# Altium footprint library MS-Electronic.PcbLib: 213 footprints (part 9 of 14)
Each footprint in its own frame and in the unit in brackets; x right, y up, seen from the top. Pads: shape width x height; smd on the part's side, far side on the other; paste and mask are expansions set on the pad; w line width, h text height; cw(c..) or ccw(c..) is an arc to the next point about the centre after c.
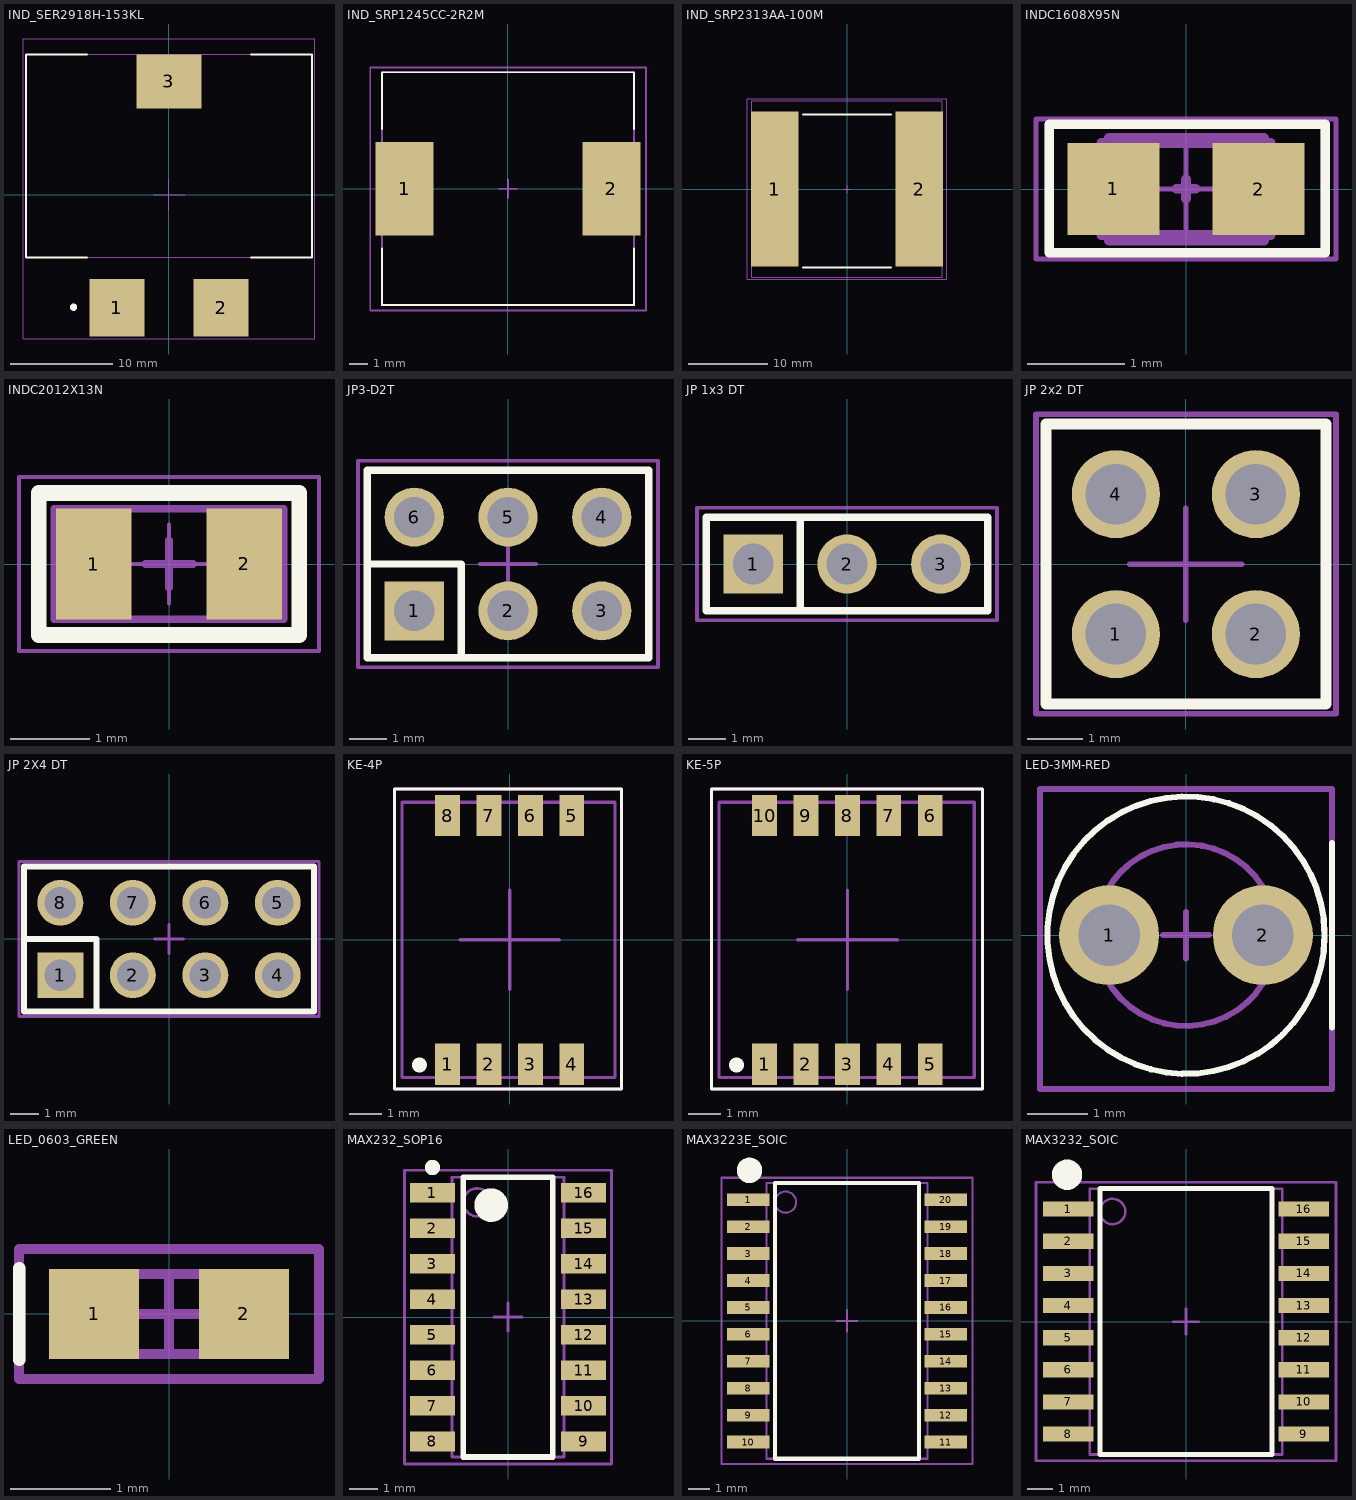
[diagram p8: the footprints below, top view; thin cyan lines are the x and y axes]

## IND_SER2918H-153KL [mm]
pads (3):
  rect 5.33x5.59 smd: 1(-5.075,-11.037) 2(5.075,-11.037)
  rect 6.35x5.28 smd: 3(0,11.038)
Top Overlay:
  circle w0.4: c-9.3,-10.982 r0.15
  circle w0.3: c-9.3,-10.982 r0.15
  lines w0.2: -7.99,-6.122 -13.95,-6.122 -13.95,13.678 -7.99,13.678 ; 7.99,-6.122 13.95,-6.122 13.95,13.678 7.99,13.678
Top Assembly:
  circle w0.3: c-9.3,-10.982 r0.15
  lines w0.1: -13.95,-6.122 -13.95,13.678 13.95,13.678 13.95,-6.122 -13.95,-6.122
  text ".Designator" at -4.998,-0.333 h1
Top Component Center (Mech15):
  lines w0.1: -1.524,0 0,0 ; 0,-1.524 0,0 ; 0,1.524 0,0 ; 1.524,0 0,0 ; -14.2,-14.082 -14.2,15.168 14.2,15.168 14.2,-14.082 7.99,-14.082 -7.99,-14.082 -14.2,-14.082
3D body "step_temp.STEP": height 17.98, standoff 0.2, extent -13.95,-13.483 13.95,14.458

## IND_SRP1245CC-2R2M [mm]
height 5
pads (2):
  rect 3.1x5 smd: 1(-5.55,0) 2(5.55,0)
Top Overlay:
  lines w0.1: -6.756,-3.2 -6.756,-6.248 6.756,-6.248 6.756,-3.2 ; -6.756,3.2 -6.756,6.248 6.756,6.248 6.756,3.2
Top Assembly:
  lines w0.1: -6.756,-6.248 -6.756,6.248 6.756,6.248 6.756,-6.248 -6.756,-6.248
  text ".Designator" at -2.499,-0.167 h0.5
Top Component Center (Mech15):
  lines w0.1: -0.5,0 0.5,0 ; 0,-0.5 0,0.5 ; -7.392,-6.538 -7.392,6.505 7.409,6.505 7.409,-6.538 -7.392,-6.538
3D body "SRP1245CC-2R2M.stp": height 5, standoff 0, extent -6.75,-6.25 6.75,6.25

## IND_SRP2313AA-100M [mm]
height 13
pads (2):
  rect 6x19.6 smd: 1(-9.125,0) 2(9.125,0)
Top Overlay:
  lines w0.2: -5.588,-9.906 5.588,-9.906 ; -5.588,9.398 5.588,9.398
Top Assembly:
  lines w0.1: -12,-11.15 12,-11.15 12,11.15 -12,11.15 -12,-11.15
  text ".Designator" at -4.998,-0.333 h1
Top Component Center (Mech15):
  lines w0.1: -0.5,0 0.5,0 ; 0,-0.5 0,0.5 ; -12.6,-11.4 12.6,-11.4 12.6,11.4 -12.6,11.4 -12.6,-11.4
3D body "SRP2313AA-100M.stp": height 13, standoff 0, extent -11.75,-11 11.75,11

## INDC1608X95N [mm] "Chip Inductor, 2-Leads, Body 1.75x0.95x0.95mm (0603)"
height 0.95
pads (2):
  rect 0.95x0.95 smd: 1(-0.75,0) 2(0.75,0)
Top Overlay:
  lines w0.1: -1.413,-0.659 1.437,-0.659 1.437,0.668 -1.413,0.668 -1.413,-0.659
Top Assembly:
  lines w0.1: -0.797,-0.534 -0.797,0.527 0.806,0.527 0.806,-0.534 -0.797,-0.534
  text ".Designator" at -2.499,-0.167 h0.5
Bottom 3D Body:
  lines w0.1: -0.875,-0.475 0.875,-0.475 0.875,0.475 -0.875,0.475 -0.875,-0.475
Top Component Center (Mech15):
  lines w0.1: -0.102,0.002 -0.002,0.002 0.098,0.002 ; 0,-0.1 0,0 0,0.1 ; -1.413,-0.659 1.437,-0.659 1.437,0.668 -1.413,0.668 -1.413,-0.659
Mechanical 17:
  lines w0.05: -0.475,0 0.475,0 ; 0,-0.475 0,0.475 ; -1.55,-0.725 1.55,-0.725 1.55,0.725 -1.55,0.725 -1.55,-0.725
3D body "Chip Inductor 0603.step": height 0.8, standoff 0, extent -0.8,-0.475 0.8,0.475

## INDC2012X13N [mm] "Chip Inductor, 2-Leads, Body 2.0x1.2x1.3 (0805)"
height 1.3
pads (2):
  rect 0.96x1.4 smd: 1(-0.952,0) 2(0.952,0)
Top Overlay:
  lines w0.2: -1.65,-0.9 -1.65,0.9 1.65,0.9 1.65,-0.9 -1.65,-0.9
Top Assembly:
  lines w0.1: -1.452,-0.7 -1.452,0.7 1.452,0.7 1.452,-0.7 -1.452,-0.7
  text ".Designator" at -2.499,-0.167 h0.5
Bottom 3D Body:
  lines w0.1: -1.452,-0.7 1.452,-0.7 1.452,0.7 -1.452,0.7 -1.452,-0.7
Top Component Center (Mech15):
  lines w0.1: -0.3,0 0,0 ; 0,-0.3 0,0 ; 0,0.3 0,0 ; 0.006,-0.001 0.306,-0.001 ; 1.65,-0.9 1.65,-0.9 ; 1.65,-0.9 1.65,0.9 -1.65,0.9 -1.65,-0.9 1.65,-0.9
Mechanical 17:
  lines w0.05: -0.5,0 0.5,0 ; 0,-0.5 0,0.5 ; -1.9,-1.1 1.9,-1.1 1.9,1.1 -1.9,1.1 -1.9,-1.1
3D body "Chip InductorINDC2012X130N.step": height 1.18, standoff -0.02, extent -1,-0.65 1,0.65

## JP3-D2T [mm] "6 pins, dual pin, straight, gold plating"
height 8.54
pads (6):
  rect 1.6x1.6 hole 1.1: 1(-2.54,-1.27)
  round 1.6 hole 1.1: 2(0,-1.27) 3(2.54,-1.27) 4(2.54,1.27) 5(0,1.27) 6(-2.54,1.27)
Top Overlay:
  lines w0.2: -3.81,0 -1.27,0 -1.27,-2.54 ; -3.81,-2.54 -3.81,2.54 3.81,2.54 3.81,-2.54 -3.81,-2.54
Top Assembly:
  lines w0.1: -3.81,-2.54 3.81,-2.54 3.81,2.54 -3.81,2.54 -3.81,-2.54
  text ".Designator" at -2.999,-0.2 h0.6
Top Component Center (Mech15):
  lines w0.1: -0.762,0 0,0 ; 0,-0.762 0,0 ; 0,0.762 0,0 ; 0.762,0 0,0 ; -4.064,-2.794 4.064,-2.794 4.064,2.794 -4.064,2.794 -4.064,-2.794
3D body "61300621121.stp": height 8.55, standoff -2.99, extent -3.81,-2.54 3.81,2.54

## JP 1x3 DT [mm]
height 8.54
pads (3):
  rect 1.6x1.6 hole 1.1: 1(-2.54,0)
  round 1.6 hole 1.1: 2(0,0) 3(2.54,0)
Top Overlay:
  lines w0.2: -1.27,-1.27 -1.27,1.27 ; -3.81,-1.27 -3.81,1.27 3.81,1.27 3.81,-1.27 -3.81,-1.27
Top Assembly:
  lines w0.1: -3.81,-1.27 -3.81,1.27 3.81,1.27 3.81,-1.27 -3.81,-1.27
  text ".Designator" at -2.499,-0.167 h0.5
Top Component Center (Mech15):
  lines w0.1: -0.508,0 0,0 ; 0,-0.508 0,0 ; 0,0.508 0,0 ; 0.508,0 0,0 ; -4.064,-1.524 4.064,-1.524 4.064,1.524 -4.064,1.524 -4.064,-1.524
3D body "61300311121.stp": height 8.54, standoff -3, extent -3.81,-1.27 3.81,1.27

## JP 2x2 DT [mm] "JP 2x2 DT"
height 8.54
pads (4):
  round 1.6 hole 1.1: 1(-1.27,-1.27) 2(1.27,-1.27) 3(1.27,1.27) 4(-1.27,1.27)
Top Overlay:
  lines w0.2: -2.54,-2.54 -2.54,2.54 2.54,2.54 2.54,-2.54 -2.54,-2.54
Top Assembly:
  lines w0.1: -2.54,-2.54 -2.54,2.54 2.54,2.54 2.54,-2.54 -2.54,-2.54
  text ".Designator" at -3.999,-0.267 h0.8
Top Component Center (Mech15):
  lines w0.1: -1.016,0 0,0 ; 0,-1.016 0,0 ; 0,1.016 0,0 ; 1.016,0 0,0 ; -2.721,-2.718 -2.721,2.72 2.724,2.72 2.724,-2.718 -2.721,-2.718
3D body "61300421121.stp": height 8.55, standoff -2.99, extent -2.54,-2.54 2.54,2.54

## JP 2X4 DT [mm]
height 8.54
pads (8):
  rect 1.61x1.6 hole 1.1: 1(-3.81,-1.27)
  oval 1.61x1.6 hole 1.1: 2(-1.27,-1.27) 3(1.27,-1.27) 4(3.81,-1.27) 5(3.81,1.27) 6(1.27,1.27) 7(-1.27,1.27) 8(-3.81,1.27)
Top Overlay:
  lines w0.2: -5.08,0 -2.54,0 -2.54,-2.54 ; -5.08,-2.54 -5.08,2.54 5.08,2.54 5.08,-2.54 -5.08,-2.54
Top Assembly:
  lines w0.1: -5.08,-2.54 5.08,-2.54 5.08,2.54 -5.08,2.54 -5.08,-2.54
  text ".Designator" at -3.999,-0.267 h0.8
Top Component Center (Mech15):
  lines w0.1: -0.508,0 0,0 ; 0,-0.508 0,0 ; 0,0.508 0,0 ; 0.508,0 0,0 ; -5.258,-2.718 -5.258,2.716 5.255,2.716 5.255,-2.718 -5.258,-2.718
3D body "61300821121.stp": height 8.55, standoff -2.99, extent -5.08,-2.54 5.08,2.54

## KE-4P [mm]
pads (8):
  rect 0.76x1.27 smd: 1(-1.905,-3.81) 2(-0.635,-3.81) 3(0.635,-3.81) 4(1.905,-3.81) 5(1.905,3.81) 6(0.635,3.81) 7(-0.635,3.81) 8(-1.905,3.81)
Top Overlay:
  circle w0.4: c-2.769,-3.835 r0.028
  lines w0.1: -3.531,-4.572 3.429,-4.572 3.429,4.623 -3.531,4.623 -3.531,-4.572
Top Assembly:
  lines w0.1: -3.302,-4.216 3.226,-4.216 3.226,4.216 -3.302,4.216 -3.302,-4.216
  text ".Designator" at -3.999,-0.267 h0.8
Top Component Center (Mech15):
  lines w0.1: -1.524,0 0,0 ; 0,-1.524 0,0 ; 0,1.524 0,0 ; 1.524,0 0,0 ; -3.531,-4.572 3.429,-4.572 3.429,4.623 -3.531,4.623 -3.531,-4.572
3D body: height 2.65, standoff 0, extent -3.302,-4.216 3.226,4.216

## KE-5P [mm]
pads (10):
  rect 0.76x1.27 smd: 1(-2.54,-3.81) 2(-1.27,-3.81) 3(0,-3.81) 4(1.27,-3.81) 5(2.54,-3.81) 6(2.54,3.81) 7(1.27,3.81) 8(0,3.81) 9(-1.27,3.81) 10(-2.54,3.81)
Top Overlay:
  circle w0.4: c-3.404,-3.835 r0.028
  lines w0.1: -4.166,-4.572 4.14,-4.572 4.14,4.623 -4.166,4.623 -4.166,-4.572
Top Assembly:
  lines w0.1: -3.937,-4.216 3.886,-4.216 3.886,4.216 -3.937,4.216 -3.937,-4.216
  text ".Designator" at -3.999,-0.267 h0.8
Top Component Center (Mech15):
  lines w0.1: -1.524,0 0,0 ; 0,-1.524 0,0 ; 0,1.524 0,0 ; 1.524,0 0,0 ; -4.166,-4.572 4.14,-4.572 4.14,4.623 -4.166,4.623 -4.166,-4.572
3D body: height 2.65, standoff 0, extent -3.937,-4.216 3.886,4.216

## LED-3MM-RED [mil]
pads (2):
  round 65 hole 40: 1(-50,0) 2(50,0)
Top Overlay:
  circle w3.94: c0,0 r90.14
  lines w3.94: 95,-60 95,60
Top Assembly:
  circle w4: c0,0 r59.06
  lines w3.94: 95,-60 95,60
  text ".Designator" at -118.07,-7.87 h23.62
Top Component Center (Mech15):
  lines w3.94: -15,0 0,0 ; 0,-15 0,0 ; 0,15 0,0 ; 15,0 0,0 ; -95,-100 95,-100 95,95 -95,95 -95,-100
3D body "User Library-LED-D3R.step": height 181.1, standoff -255.91, extent -76.74,-77.48 67.18,80

## LED_0603_GREEN [mm]
height 0.6
pads (2):
  rect 0.9x0.9 smd: 1(-0.75,0) 2(0.75,0)
Top Overlay:
  lines w0.127: -1.499,-0.457 -1.499,0.457
Top Assembly:
  lines w0.1: -0.9,-0.4 0.9,-0.4 0.9,0.4 -0.9,0.4 -0.9,-0.4
  lines w0.127: -1.499,-0.457 -1.499,0.457
  text ".Designator" at -1.429,-0.143 h0.64
Top Component Center (Mech15):
  lines w0.1: -0.4,0 0.4,0 ; 0,-0.4 0,0.4 ; -1.5,-0.65 1.5,-0.65 1.5,0.65 -1.5,0.65 -1.5,-0.65
3D body "User Library-LED0603_GREEN.STEP": height 0.81, standoff 0.01, extent -0.8,-0.4 0.8,0.4

## MAX232_SOP16 [mm]
height 1.75
pads (16):
  rect 1.6x0.7 smd: 1(-2.7,4.445) 2(-2.7,3.175) 3(-2.7,1.905) 4(-2.7,0.635) 5(-2.7,-0.635) 6(-2.7,-1.905) 7(-2.7,-3.175) 8(-2.7,-4.445) 9(2.7,-4.445) 10(2.7,-3.175) 11(2.7,-1.905) 12(2.7,-0.635) 13(2.7,0.635) 14(2.7,1.905) 15(2.7,3.175) 16(2.7,4.445)
Top Overlay:
  circle w0.6: c-0.6,4 r0.3
  circle w0.3: c-2.7,5.345 r0.125
  lines w0.2: -1.6,-5 1.6,-5 1.6,5 -1.6,5 -1.6,-5
Top Assembly:
  circle w0.1: c-1.1,4.1 r0.5
  lines w0.1: -2,-5 2,-5 2,5 -2,5 -2,-5
  text ".Designator" at -2.999,-0.2 h0.6
Top Component Center (Mech15):
  lines w0.1: -0.5,0 0.5,0 ; 0,-0.5 0,0.5 ; -3.7,-5.25 3.7,-5.25 3.7,5.25 -3.7,5.25 -3.7,-5.25
3D body "MAX232_SOP16.step": height 1.75, standoff 0, extent -3,-5 3,5

## MAX3223E_SOIC [mm]
height 2.65
pads (20):
  rect 2x0.6 smd: 1(-4.65,5.715) 2(-4.65,4.445) 3(-4.65,3.175) 4(-4.65,1.905) 5(-4.65,0.635) 6(-4.65,-0.635) 7(-4.65,-1.905) 8(-4.65,-3.175) 9(-4.65,-4.445) 10(-4.65,-5.715) 11(4.65,-5.715) 12(4.65,-4.445) 13(4.65,-3.175) 14(4.65,-1.905) 15(4.65,-0.635) 16(4.65,0.635) 17(4.65,1.905) 18(4.65,3.175) 19(4.65,4.445) 20(4.65,5.715)
Top Overlay:
  circle w0.6: c-4.6,7.1 r0.3
  lines w0.2: -3.4,-6.5 -3.4,6.5 3.4,6.5 3.4,-6.5 -3.4,-6.5
Top Assembly:
  circle w0.1: c-2.9,5.6 r0.5
  lines w0.1: -3.8,-6.5 -3.8,6.5 3.8,6.5 3.8,-6.5 -3.8,-6.5
  text ".Designator" at -2.499,-0.167 h0.5
Top Component Center (Mech15):
  lines w0.1: -0.5,0 0.5,0 ; 0,-0.5 0,0.5 ; -5.925,-6.75 -5.925,6.75 5.925,6.75 5.925,-6.75 -5.925,-6.75
3D body "MAX3223E.step": height 2.65, standoff 0, extent -5.15,-6.5 5.15,6.5

## MAX3232_SOIC [mm]
height 2.65
pads (16):
  rect 2x0.6 smd: 1(-4.65,4.445) 2(-4.65,3.175) 3(-4.65,1.905) 4(-4.65,0.635) 5(-4.65,-0.635) 6(-4.65,-1.905) 7(-4.65,-3.175) 8(-4.65,-4.445) 9(4.65,-4.445) 10(4.65,-3.175) 11(4.65,-1.905) 12(4.65,-0.635) 13(4.65,0.635) 14(4.65,1.905) 15(4.65,3.175) 16(4.65,4.445)
Top Overlay:
  circle w0.6: c-4.7,5.8 r0.3
  lines w0.2: -3.4,-5.25 3.4,-5.25 3.4,5.25 -3.4,5.25 -3.4,-5.25
Top Assembly:
  circle w0.1: c-2.9,4.35 r0.5
  lines w0.1: -3.8,-5.25 3.8,-5.25 3.8,5.25 -3.8,5.25 -3.8,-5.25
  text ".Designator" at -2.999,-0.2 h0.6
Top Component Center (Mech15):
  lines w0.1: -0.5,0 0.5,0 ; 0,-0.5 0,0.5 ; -5.925,-5.5 5.925,-5.5 5.925,5.5 -5.925,5.5 -5.925,-5.5
3D body "MAX3232.step": height 2.65, standoff 0, extent -5.15,-5.25 5.15,5.25